# Altium footprint library CeleronLib_THD.PcbLib: 217 footprints (part 4 of 14)
Each footprint in its own frame and in the unit in brackets; x right, y up, seen from the top. Pads: shape width x height; smd on the part's side, far side on the other; paste and mask are expansions set on the pad; w line width, h text height; cw(c..) or ccw(c..) is an arc to the next point about the centre after c.
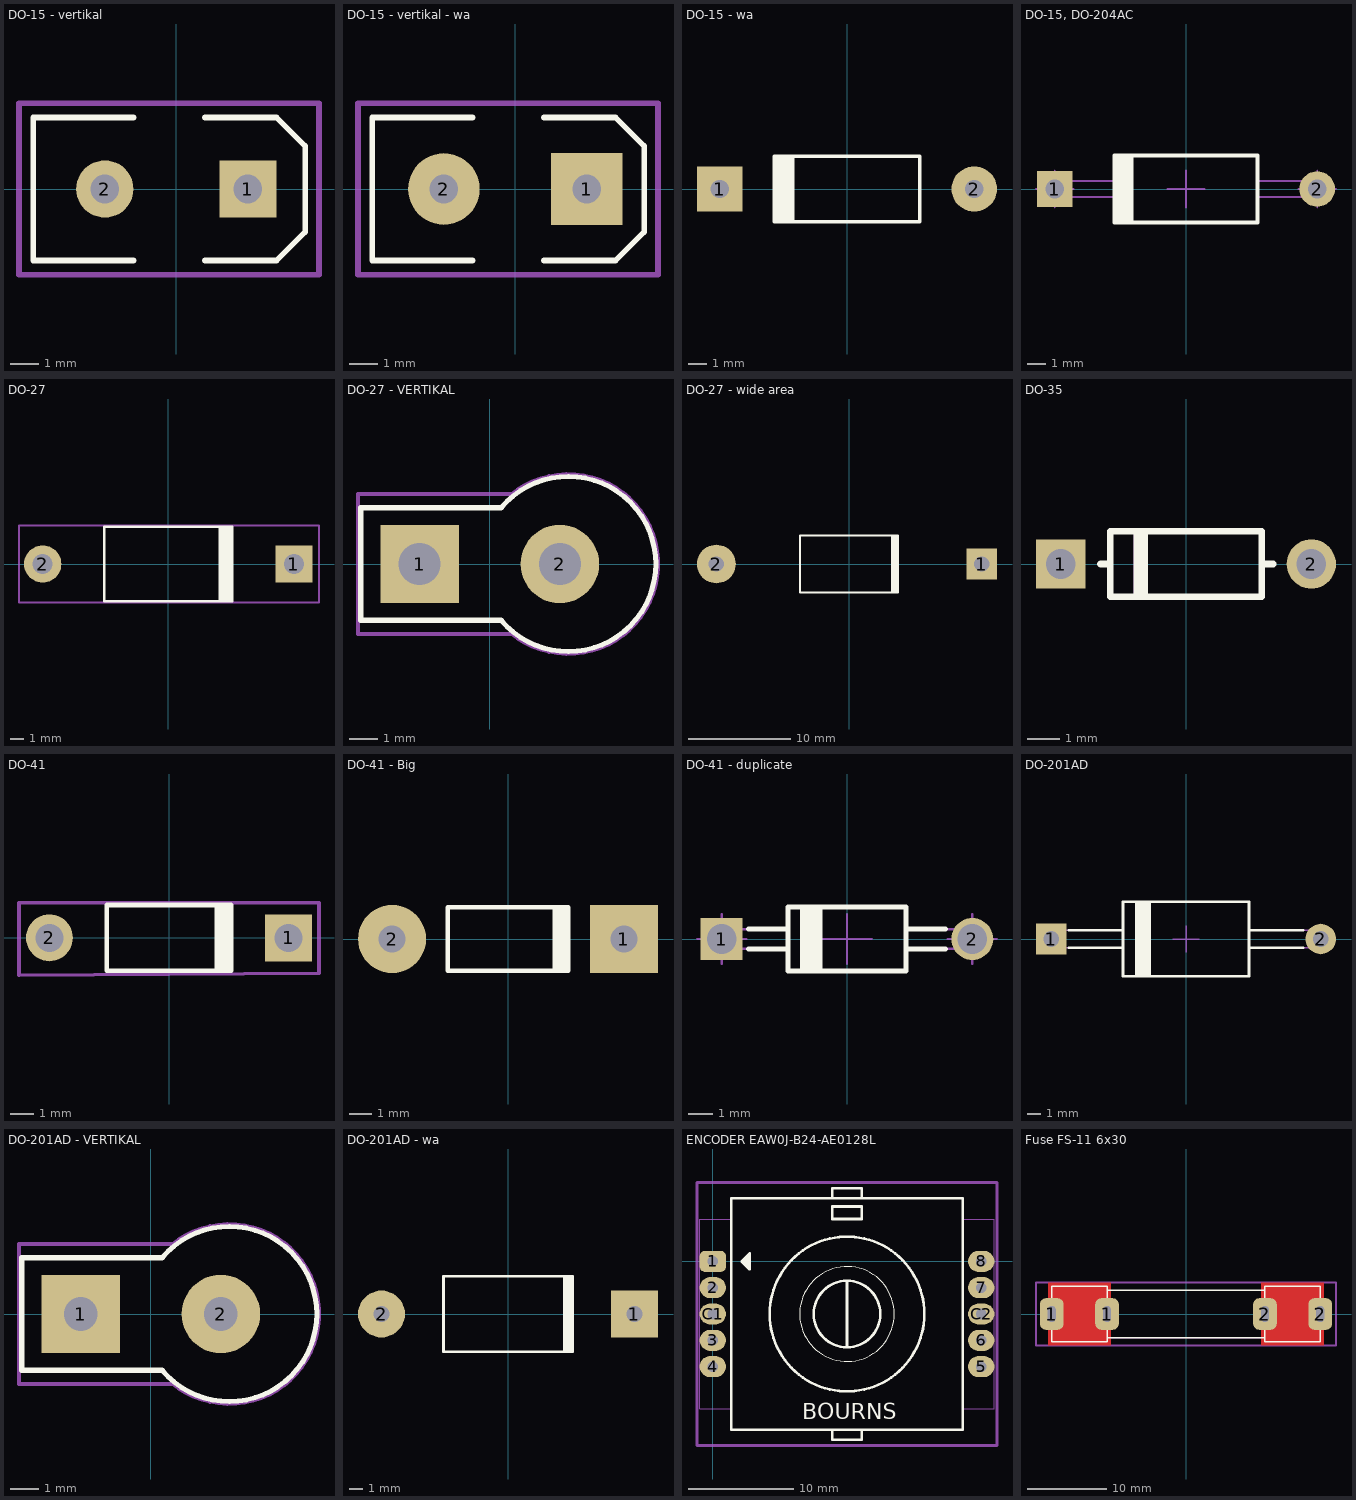
[diagram p3: the footprints below, top view; thin cyan lines are the x and y axes]

## DO-15 - vertikal [mm] "Диод импульсный 2 A, 1000 V. TECHNICAL SPECIFICATIONS OF FAST RECOVERY RECTIFIER"
height 8
pads (2):
  rect 2x2 hole 1: 1(2.5,0)
  round 2 hole 1: 2(-2.5,0)
Top Overlay:
  lines w0.2: -1.5,-2.5 -5,-2.5 -5,2.5 -3.5,2.5 -1.5,2.5 ; 1,-2.5 3.5,-2.5 4.5,-1.5 4.5,1.5 3.5,2.5 1,2.5
Top Courtyard:
  lines w0.2: -5.5,-3 -5.5,3 4.984,3 4.984,-3 -5.5,-3

## DO-15 - vertikal - wa [mm] "Диод импульсный 2 A, 1000 V. TECHNICAL SPECIFICATIONS OF FAST RECOVERY RECTIFIER"
height 8
pads (2):
  rect 2.5x2.5 hole 1: 1(2.5,0)
  round 2.5 hole 1: 2(-2.5,0)
Top Overlay:
  lines w0.2: -1.5,-2.5 -5,-2.5 -5,2.5 -3.5,2.5 -1.5,2.5 ; 1,-2.5 3.5,-2.5 4.5,-1.5 4.5,1.5 3.5,2.5 1,2.5
Top Courtyard:
  lines w0.2: -5.5,-3 -5.5,3 4.984,3 4.984,-3 -5.5,-3

## DO-15 - wa [mm] "Диод импульсный 2 A, 1000 V. TECHNICAL SPECIFICATIONS OF FAST RECOVERY RECTIFIER"
height 5
pads (2):
  rect 2.5x2.5 hole 1: 1(-7,0)
  round 2.5 hole 1: 2(7,0)
Top Overlay:
  rectangle: -3.9,-1.7 -2.9,1.7
  lines w0.2: -4,-1.8 4,-1.8 4,1.8 -4,1.8 -4,-1.8
3D body: height 3.56, standoff -3.2, extent -7.43,-1.78 7.4,1.78

## DO-15, DO-204AC [mm] "DO-15, Diode, Axial, Body 7.62 x 3.56mm (LxDia. Max), Pin spacing 13.97mm"
height 3.56
pads (2):
  rect 1.9x1.9 hole 1: 1(-6.985,0)
  round 1.9 hole 1: 2(6.985,0)
Top Overlay:
  rectangle: -3.8,-1.8 -2.8,1.8
  lines w0.2: -3.81,-1.78 3.81,-1.78 3.81,1.78 -3.81,1.78 -3.81,-1.78
Mechanical 8:
  lines w0.1: -7.985,0 -6.985,0 ; -6.985,-1 -6.985,0 ; -6.985,1 -6.985,0 ; -5.985,0 -6.985,0 ; -1,0 0,0 ; 0,-1 0,0 ; 0,1 0,0 ; 1,0 0,0 ; 5.985,0 6.985,0 ; 6.985,-1 6.985,0 ; 6.985,1 6.985,0 ; 7.985,0 6.985,0
Top Assy:
  lines w0.1: -3.81,-0.43 -6.985,-0.43 cw(c-6.985,0) -6.985,0.43 -3.81,0.43 ; 3.81,-0.43 6.985,-0.43 ccw(c6.985,0) 6.985,0.43 3.81,0.43 ; -3.81,-1.78 -3.81,1.78 3.81,1.78 3.81,-1.78 -3.81,-1.78
3D body: height 3.56, standoff -3.2, extent -7.415,-1.78 7.415,1.78

## DO-27 [mm] "Diode, Axial; Body 9.5 x 5.6 mm (LxDia. max), Lead Dia. 1.32 mm (max)"
height 5.6
pads (2):
  rect 2.8x2.8 hole 1.5: 1(9.42,0)
  round 2.8 hole 1.5: 2(-9.42,0)
Top Overlay:
  rectangle: 3.75,-2.8 4.9,2.8
  lines w0.2: 4.8,-2.8 -4.8,-2.8 -4.8,2.8 4.8,2.8
Top Courtyard:
  lines w0.15: -11.2,-2.9 -11.2,2.9 11.3,2.9 11.3,-2.9 -11.2,-2.9
3D body: height 5.5, standoff -4.28, extent -10.15,-2.555 9.9,2.455

## DO-27 - VERTIKAL [mm] "Diode, Axial; Body 9.5 x 5.6 mm (LxDia. max), Lead Dia. 1.32 mm (max)"
height 5.6
pads (2):
  rect 2.8x2.8 hole 1.5: 1(-2.5,0)
  round 2.8 hole 1.5: 2(2.5,0)
Top Overlay:
  lines w0.178: 0.4,-2 ccw(c2.8,0) 0.4,2
  lines w0.2: 0.4,-2 -4.6,-2 -4.6,2 0.4,2
Top Courtyard:
  lines w0.15: 0.741,-2.451 ccw(c2.8,0) 0.741,2.451 ; 0.8,-2.5 -4.7,-2.5 -4.7,2.5 0.8,2.5
3D body: height 15.69, standoff -3, extent -3.15,-2.8 5.39,2.8

## DO-27 - wide area [mm] "Diode, Axial; Body 9.5 x 5.6 mm x 26 mm (LxDia. max), Lead Dia. 1.32 mm (max)"
height 5.6
pads (2):
  rect 3x3 hole 1.5: 1(13,0)
  round 3.8 hole 1.5: 2(-13,0)
Top Overlay:
  rectangle: 4.1,-2.8 4.9,2.8
  lines w0.2: 4.8,-2.8 -4.8,-2.8 -4.8,2.8 4.8,2.8

## DO-35 [mm] "Diode, Axial, Body 4.6 x 2 mm (LxDia. max), Pin spacing 7.62mm"
height 2
pads (2):
  rect 1.5x1.5 hole 0.9: 1(-3.81,0)
  round 1.5 hole 0.9: 2(3.81,0)
Top Overlay:
  lines w0.2: -2.6,0 -2.35,0 ; -1.499,-1 -1.499,0.999 ; -1.45,-1 -1.45,0.999 ; -1.401,-1 -1.401,0.999 ; -1.352,-1 -1.352,0.999 ; -1.303,-1 -1.303,0.999 ; -1.254,-1 -1.254,0.999 ; 2.4,0 2.65,0 ; -2.298,-1 2.3,-1 2.3,1 -2.298,1 -2.298,-1
Top Assy:
  lines w0.1: -2.6,0 -2.35,0 ; -1.55,-1 -1.55,1 ; -1.501,-1 -1.501,1 ; -1.499,-1 -1.499,1 ; -1.452,-1 -1.452,1 ; -1.403,-1 -1.403,1 ; -1.354,-1 -1.354,1 ; -1.305,-1 -1.305,1 ; -1.205,-1 -1.205,1 ; 2.35,0 2.6,0 ; -2.3,-1 -2.3,1 2.3,1 2.3,-1 -2.3,-1 ; -1.45,-1 -1.45,1 -1.45,-1 ; -1.401,-1 -1.401,1 -1.401,-1 ; -1.352,-1 -1.352,1 -1.352,-1 ; -1.303,-1 -1.303,1 -1.303,-1 ; -1.254,-1 -1.254,1 -1.254,-1
3D body: height 1.91, standoff -3, extent -4.076,-0.955 4.077,0.955

## DO-41 [mm] "Diode, Axial; Body 5.2 x 2.7 mm (LxDia. max), Lead Dia. 0.86 mm (max)"
height 2.8
pads (2):
  rect 2x2 hole 1.2: 1(5.1,0)
  round 2 hole 1.2: 2(-5.1,0)
Top Overlay:
  rectangle: 1.95,-1.4 2.75,1.4
  lines w0.2: 2.65,-1.4 -2.65,-1.4 -2.65,1.4 2.65,1.4
Top Courtyard:
  lines w0.15: -6.4,-1.6 6.4,-1.502 6.4,1.5 -6.4,1.5 -6.4,0 -6.4,-1.6
3D body: height 3.35, standoff -2, extent -5.53,-1.35 5.49,1.35

## DO-41 - Big [mm] "Diode, Axial; Body 5.2 x 2.7 mm (LxDia. max), Lead Dia. 0.86 mm (max)"
height 2.8
pads (2):
  rect 3x3 hole 1.2: 1(5.1,0)
  round 3 hole 1.2: 2(-5.1,0)
Top Overlay:
  rectangle: 1.95,-1.4 2.75,1.4
  lines w0.2: 2.65,-1.4 -2.65,-1.4 -2.65,1.4 2.65,1.4
3D body: height 3.35, standoff -2, extent -5.53,-1.35 5.49,1.35

## DO-41 - duplicate [mm] "DO-41, Diode, Axial, Body 4.7 x 2.7 mm (LxDia. max), Pin spacing 10.16mm"
height 2.8
pads (2):
  rect 1.7x1.7 hole 1.2: 1(-5.08,0)
  round 1.7 hole 1.2: 2(5.08,0)
Top Overlay:
  lines w0.2: -4.002,-0.4 -2.4,-0.4 ; -4.002,0.4 -2.4,0.4 ; -1.8,-1.3 -1.8,1.3 ; -1.7,-1.3 -1.7,1.3 ; -1.6,-1.3 -1.6,1.3 ; -1.5,-1.3 -1.5,1.3 ; -1.4,-1.3 -1.4,1.3 ; -1.3,-1.3 -1.3,1.3 ; -1.2,-1.3 -1.2,1.3 ; -1.1,-1.3 -1.1,1.3 ; 2.4,-0.4 4.002,-0.4 ; 2.4,0.4 4.002,0.4 ; -2.4,-1.3 2.4,-1.3 2.4,1.3 -2.4,1.3 -2.4,-1.3
Mechanical 8:
  lines w0.1: -6.08,0 -5.08,0 ; -5.08,-1 -5.08,0 ; -5.08,1 -5.08,0 ; -4.08,0 -5.08,0 ; -1,0 0,0 ; 0,-1 0,0 ; 0,1 0,0 ; 1,0 0,0 ; 4.08,0 5.08,0 ; 5.08,-1 5.08,0 ; 5.08,1 5.08,0 ; 6.08,0 5.08,0
Top Assy:
  lines w0.1: -2.4,-0.4 -5.08,-0.4 cw(c-5.08,0) -5.08,0.4 -2.4,0.4 ; -1.8,-1.3 -1.8,1.3 ; -1.7,-1.3 -1.7,1.3 ; -1.6,-1.3 -1.6,1.3 ; -1.5,-1.3 -1.5,1.3 ; -1.4,-1.3 -1.4,1.3 ; -1.3,-1.3 -1.3,1.3 ; -1.2,-1.3 -1.2,1.3 ; -1.1,-1.3 -1.1,1.3 ; 2.4,-0.4 5.08,-0.4 ccw(c5.08,0) 5.08,0.4 2.4,0.4 ; -2.4,-1.3 -2.4,1.3 2.4,1.3 2.4,-1.3 -2.4,-1.3
3D body: height 2.6, standoff -3.2, extent -5.48,-1.3 5.48,1.3

## DO-201AD [mm] "DO-201AD, Diode, Axial; Lead Spacing 20.32mm, Lead Dia. 1.3mm, Body Length 9.5mm, Body Dia. 5.6mm"
height 5.6
pads (2):
  rect 2.3x2.3 hole 1.2: 1(-10.16,0)
  round 2.3 hole 1.2: 2(10.16,0)
Top Overlay:
  lines w0.2: -8.85,-0.65 -4.75,-0.65 ; -8.85,0.65 -4.75,0.65 ; -3.75,-2.8 -3.75,2.8 ; -3.55,-2.8 -3.55,2.8 ; -3.35,-2.8 -3.35,2.8 ; -3.15,-2.8 -3.15,2.8 ; -2.95,-2.8 -2.95,2.8 ; -2.75,-2.8 -2.75,2.8 ; 4.75,-0.65 8.85,-0.65 ; 4.75,0.65 8.85,0.65 ; -4.75,-2.8 -4.75,2.8 4.75,2.8 4.75,-2.8 -4.75,-2.8
Mechanical 8:
  lines w0.1: -11.16,0 -10.16,0 ; -10.16,-1 -10.16,0 ; -10.16,1 -10.16,0 ; -9.16,0 -10.16,0 ; -1,0 0,0 ; 0,-1 0,0 ; 0,1 0,0 ; 1,0 0,0 ; 9.16,0 10.16,0 ; 10.16,-1 10.16,0 ; 10.16,1 10.16,0 ; 11.16,0 10.16,0
Top Assy:
  lines w0.1: -4.75,-0.65 -10.16,-0.65 cw(c-10.16,0) -10.16,0.65 -4.75,0.65 ; -3.75,-2.8 -3.75,2.8 ; -3.55,-2.8 -3.55,2.8 ; -3.35,-2.8 -3.35,2.8 ; -3.15,-2.8 -3.15,2.8 ; -2.95,-2.8 -2.95,2.8 ; -2.75,-2.8 -2.75,2.8 ; 4.75,-0.65 10.16,-0.65 ccw(c10.16,0) 10.16,0.65 4.75,0.65 ; -4.75,-2.8 -4.75,2.8 4.75,2.8 4.75,-2.8 -4.75,-2.8
3D body: height 5.6, standoff -3.8, extent -10.81,-2.8 10.81,2.8

## DO-201AD - VERTIKAL [mm] "Diode, Axial; Body 9.5 x 5.6 mm (LxDia. max), Lead Dia. 1.32 mm (max)"
height 5.6
pads (2):
  rect 2.8x2.8 hole 1.2: 1(-2.5,0)
  round 2.8 hole 1.2: 2(2.5,0)
Top Overlay:
  lines w0.178: 0.4,-2 ccw(c2.8,0) 0.4,2
  lines w0.2: 0.4,-2 -4.6,-2 -4.6,2 0.4,2
Top Courtyard:
  lines w0.15: 0.741,-2.451 ccw(c2.8,0) 0.741,2.451 ; 0.8,-2.5 -4.7,-2.5 -4.7,2.5 0.8,2.5
3D body: height 15.69, standoff -3, extent -3.15,-2.8 5.39,2.8

## DO-201AD - wa [mm] "Diode, Axial; Body 9.5 x 5.6 mm (LxDia. max), Lead Dia. 1.32 mm (max)"
height 5.6
pads (2):
  rect 3.5x3.5 hole 1.2: 1(9.42,0)
  round 3.5 hole 1.2: 2(-9.42,0)
Top Overlay:
  rectangle: 4.1,-2.8 4.9,2.8
  lines w0.2: 4.8,-2.8 -4.8,-2.8 -4.8,2.8 4.8,2.8
3D body: height 5.5, standoff -4.28, extent -10.25,-2.555 9.8,2.455

## ENCODER EAW0J-B24-AE0128L [mm] "Абсолютный энкодер BOURNS EAW0J-B24-AE0128L  (8-битный но 128PPR тиков на оборот)"
height 27
pads (10):
  rrect50% 2.5x2 hole 1: 1(0,0)
  oval 2.5x2 hole 1: 2(0,-2.5) 3(0,-7.5) 4(0,-10) 5(25.5,-10) 6(25.5,-7.5) 7(25.5,-2.5) 8(25.5,0) C1(0,-5) C2(25.5,-5)
Top Overlay:
  circle w0.254: c12.75,-5 r7.35
  circle w0.1: c12.75,-5 r4.5
  circle w0.254: c12.75,-5 r3.16
  lines w0.254: 2.875,-0.125 3.5,0.5 ; 3.125,-0.375 3.5,0 ; 3.25,-0.5 3.5,-0.25 ; 3.5,0.25 3,-0.25 ; 11.35,-16 11.35,-16.94 14.15,-16.94 14.15,-16 ; 11.35,6 11.35,6.94 14.15,6.94 14.15,6 ; 12.75,-8.16 12.75,-1.84 ; 3,-0.25 3,-0.25 ; 3.5,0.5 3.5,0.5 ; 3.5,0.5 3.5,0.5 ; 1.75,-16 1.75,6 23.75,6 23.75,-16 1.75,-16 ; 2.75,0 3.5,0.75 3.5,-0.75 2.75,0 ; 11.35,4.02 14.15,4.02 14.15,5.21 11.35,5.21 11.35,4.02
  text "BOURNS" at 8.5,-15 h1.52
Top 3D:
  circle w0.1: c25.5,0 r0.4
  circle w0.1: c25.5,-2.5 r0.4
  circle w0.1: c25.5,-5 r0.4
  circle w0.1: c25.5,-7.5 r0.4
  circle w0.1: c25.5,-10 r0.4
  circle w0.1: c0,-10 r0.4
  circle w0.1: c0,-7.5 r0.4
  circle w0.1: c0,-5 r0.4
  circle w0.1: c0,-2.5 r0.4
  circle w0.1: c0,0 r0.4
  circle w0.1: c12.75,-5 r3.16
  circle w0.1: c12.75,-5 r7.35
  lines w0.1: 1.75,-14 -1.25,-14 -1.25,4 1.75,4 ; 23.75,-14 26.75,-14 26.75,4 23.75,4 ; 1.75,-16 23.75,-16 23.75,6 1.75,6 1.75,-16
Top Courtyard:
  lines w0.254: -1.5,-17.5 27,-17.5 27,7.5 -1.5,7.5 -1.5,-17.5
3D body: height 2, standoff -5, extent 25.093,-0.407 25.907,0.407
3D body: height 2, standoff -5, extent 25.093,-2.907 25.907,-2.093
3D body: height 2, standoff -5, extent 25.093,-5.407 25.907,-4.593
3D body: height 2, standoff -5, extent 25.093,-7.907 25.907,-7.093
3D body: height 2, standoff -5, extent 25.093,-10.407 25.907,-9.593
3D body: height 2, standoff -5, extent -0.407,-2.907 0.407,-2.093
3D body: height 2, standoff -5, extent -0.407,-5.407 0.407,-4.593
3D body: height 2, standoff -5, extent -0.407,-7.907 0.407,-7.093
3D body: height 2, standoff -5, extent -0.407,-10.407 0.407,-9.593
3D body: height 2, standoff -5, extent -0.407,-0.407 0.407,0.407
3D body: height 1.5, standoff 0, extent -1.249,-13.999 1.749,3.999
3D body: height 1.5, standoff 0, extent 23.751,-13.999 26.749,3.999
3D body: height 8, standoff 0, extent 1.751,-15.999 23.749,5.999
3D body: height 11, standoff 8, extent 5.389,-12.361 20.111,2.361
3D body: height 27, standoff 11, extent 9.581,-8.169 15.919,-1.831

## Fuse FS-11 6х30 [mm] "Держатель предохранителя одиночный FS-11 6х30 mm"
height 12
pads (4):
  rrect50% 3x4 hole 2 slot 1 at 0 deg: 1(-17,0) 1(-10,0) 2(10,0) 2(17,0)
Top Layer:
  rectangle: 9.5,-4 17.5,4
  rectangle: -17.5,-4 -9.5,4
Top Overlay:
  lines w0.2: -17,-2 -17,-3.5 -10,-3.5 -10,-2 ; -17,2 -17,3.5 -10,3.5 -10,2 ; -10,-3 10,-3 ; -10,3 10,3 ; 10,-2 10,-3.5 17,-3.5 17,-2 ; 10,2 10,3.5 17,3.5 17,2
Top Assy:
  lines w0.1: -10,-3 10,-3 ; -10,3 10,3 ; -17,-3.5 -10,-3.5 -10,3.5 -17,3.5 -17,-3.5 ; 10,-3.5 17,-3.5 17,3.5 10,3.5 10,-3.5
Top Courtyard:
  lines w0.254: -19,-4 -19,4 19,4 19,-4 -19,-4
3D body: height 12, standoff 0, extent -16.999,-3.499 -10.001,3.499
3D body: height 10, standoff 4, extent -9.999,-2.999 9.999,2.999
3D body: height 12, standoff 0, extent 10.001,-3.499 16.999,3.499